# Altium footprint library PCBLIB.PcbLib: 775 footprints (part 39 of 49)
Each footprint in its own frame and in the unit in brackets; x right, y up, seen from the top. Pads: shape width x height; smd on the part's side, far side on the other; paste and mask are expansions set on the pad; w line width, h text height; cw(c..) or ccw(c..) is an arc to the next point about the centre after c.
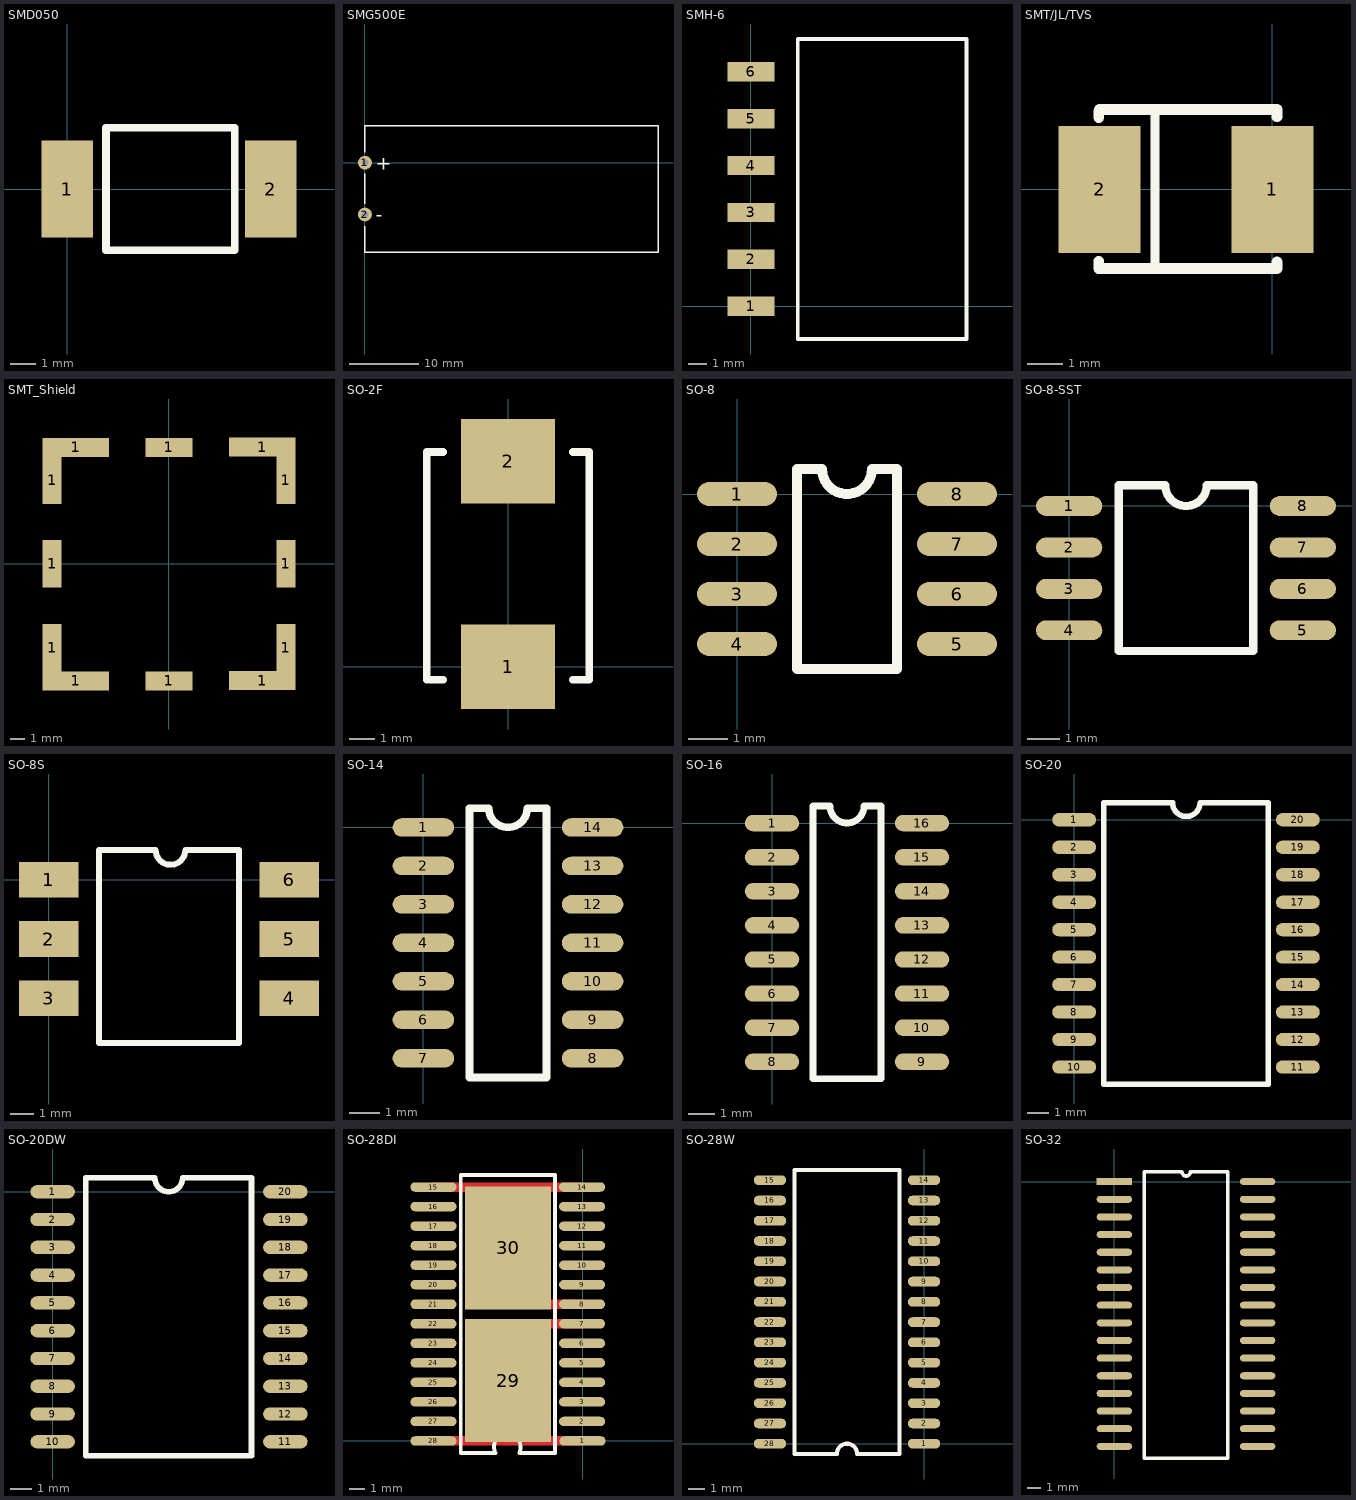
[diagram p38: the footprints below, top view; thin cyan lines are the x and y axes]

## SMD050 [mil]
pads (2):
  rect 80x150 smd: 1(0,0) 2(316,0)
TopOverlay:
  lines w12: 60,-95 60,95 260,95 260,-95 60,-95

## SMG500E [mm]
height 35.5
pads (2):
  round 2 hole 1: 1(0,0) 2(0,-7.5)
TopOverlay:
  lines w0.203: 0.009,-9.181 0.009,-12.947 42.427,-12.947 42.427,5.341 0.009,5.341 0.009,1.533 ; 0.009,-5.954 0.009,-1.605
  text "+" at 1.559,-1.031 h2.03
  text "-" at 1.594,-8.491 h2.03

## SMH-6 [mil]
pads (6):
  rect 100x41 smd: 1(0,0) 2(0,100) 3(0,200) 4(0,300) 5(0,400) 6(0,500)
TopOverlay:
  lines w8: 100,-70 100,570 460,570 460,-70 100,-70

## SMT/JL/TVS [mil]
pads (2):
  rect 90x140 smd: 1(0,0) 2(-190,0)
TopOverlay:
  lines w10: -129,-87 -129,88
  lines w12: -191,-87 -191,-79 ; -191,79 -191,86 ; -190,-87 5,-87 5,-80 ; -190,88 5,88 ; 5,80 5,87
Mechanical4:
  text ".105" at -189.77,0 h1
  text ".065" at -190,0 h1

## SMT_Shield [mm]
pads (12):
  rect 1.3x3.25 smd: 1(-8.002,0) 1(-8.002,5.716) 1(-8,-5.73) 1(8.001,-5.726) 1(8.003,0) 1(8.003,5.721)
  rect 4.55x1.3 smd: 1(-6.377,7.99) 1(-6.376,-8.005) 1(6.376,-8.001) 1(6.378,7.996)
  rect 3.25x1.3 smd: 1(0,-8.005) 1(0,7.989)

## SO-2F [mil]
pads (2):
  rect 145x130 smd: 1(0,0) 2(0,316)
TopOverlay:
  lines w12: -125,-20 -125,330 -100,330 ; -120,-20 -100,-20 ; 100,-20 125,-20 125,330 100,330
Mechanical4:
  text ".065" at 0,0 h1

## SO-8 [mil]
height 60
pads (8):
  oval 80x24 smd: 1(0,0) 2(0,-50) 3(0,-100) 4(0,-150) 5(220,-150) 6(220,-100) 7(220,-50) 8(220,0)
TopOverlay:
  lines w10: 60,-175 60,25 85,25 ccw(c110,25) 135,25 160,25 160,-175 60,-175
Mechanical4:
  text ".062" at 0,0 h1
  text ".065" at -0.44,0.48 h1

## SO-8-SST [mil]
pads (8):
  oval 80x24 smd: 1(0,0) 2(0,-50) 3(0,-100) 4(0,-150) 5(282,-150) 6(282,-100) 7(282,-50) 8(282,0)
TopOverlay:
  lines w10: 91,-175 191,-175 ; 137.71,-175 60,-175 60,25 91,25 116,25 ccw(c141,25) 166,25 191,25 222,25 222,-175 170.96,-175
Mechanical4:
  text ".062" at 31,0 h1

## SO-8S [mil]
pads (6):
  rect 100x60 smd: 1(0,0) 2(0,-100) 3(0,-200) 4(405,-200) 5(405,-100) 6(405,0)
TopOverlay:
  lines w10: 85,-275 320,-275 320,50 230,50 cw(c205,50) 180,50 85,50 85,-275

## SO-14 [mil]
height 65
pads (14):
  oval 80x24 smd: 1(0,0) 2(0,-50) 3(0,-100) 4(0,-150) 5(0,-200) 6(0,-250) 7(0,-300) 8(220,-300) 9(220,-250) 10(220,-200) 11(220,-150) 12(220,-100) 13(220,-50) 14(220,0)
TopOverlay:
  lines w10: 60,-325 160,-325 160,25 135,25 cw(c110,25) 85,25 60,25 60,-325
Mechanical4:
  text ".062" at 0,0 h1
  text ".065" at 0.19,0.86 h1

## SO-16 [mil]
pads (16):
  oval 80x24 smd: 1(0,0) 2(0,-50) 3(0,-100) 4(0,-150) 5(0,-200) 6(0,-250) 7(0,-300) 8(0,-350) 9(220,-350) 10(220,-300) 11(220,-250) 12(220,-200) 13(220,-150) 14(220,-100) 15(220,-50) 16(220,0)
TopOverlay:
  lines w10: 60,-375 160,-375 160,25 135,25 cw(c110,25) 85,25 60,25 60,-375
Mechanical4:
  text ".062" at 0,0 h1

## SO-20 [mil]
pads (20):
  oval 80x24 smd: 1(0,0) 2(0,-50) 3(0,-100) 4(0,-150) 5(0,-200) 6(0,-250) 7(0,-300) 8(0,-350) 9(0,-400) 10(0,-450) 11(407,-450) 12(407,-400) 13(407,-350) 14(407,-300) 15(407,-250) 16(407,-200) 17(407,-150) 18(407,-100) 19(407,-50) 20(407,0)
TopOverlay:
  lines w10: 54,-481 54,31 179,31 ccw(c204,31) 229,31 353,31 353,-481 54,-481
Mechanical4:
  text "0" at -1,-1 h1
  text ".062" at 0,0 h1

## SO-20DW [mil]
pads (20):
  oval 80x24 smd: 1(0,0) 2(0,-50) 3(0,-100) 4(0,-150) 5(0,-200) 6(0,-250) 7(0,-300) 8(0,-350) 9(0,-400) 10(0,-450) 11(419,-450) 12(419,-400) 13(419,-350) 14(419,-300) 15(419,-250) 16(419,-200) 17(419,-150) 18(419,-100) 19(419,-50) 20(419,0)
TopOverlay:
  lines w10: 60,-475 358,-475 358,25 234,25 cw(c209,25) 184,25 60,25 60,-475
Mechanical4:
  text ".105" at 0,0 h1
  text ".065" at 0,-0.48 h1

## SO-28DI [mm]
pads (30):
  oval 3x0.61 smd: 1(0,0) 2(-0.028,1.27) 3(-0.028,2.54) 4(-0.028,3.81) 5(-0.028,5.08) 6(-0.028,6.35) 7(-0.028,7.62) 8(-0.028,8.89) 9(-0.028,10.16) 10(-0.028,11.43) 11(-0.028,12.7) 12(-0.028,13.97) 13(-0.028,15.24) 14(-0.028,16.51) 15(-9.692,16.51) 16(-9.692,15.24) 17(-9.692,13.97) 18(-9.692,12.7) 19(-9.692,11.43) 20(-9.692,10.16) 21(-9.692,8.89) 22(-9.692,7.62) 23(-9.692,6.35) 24(-9.692,5.08) 25(-9.692,3.81) 26(-9.692,2.54) 27(-9.692,1.27) 28(-9.692,0)
  rect 5.6x8 smd: 29(-4.846,3.928) 30(-4.846,12.563)
TopLayer:
  lines w0.61: -9.692,0 0,0 ; -9.692,16.51 -0.028,16.51 ; -2.764,7.62 -0.028,7.62 ; -2.567,8.89 -0.028,8.89
TopOverlay:
  lines w0.254: -5.688,-0.744 cw(c-4.89,-0.4) -4.107,-0.777 ; -5.66,-0.795 -7.92,-0.795 -7.92,17.305 -1.8,17.305 -1.8,-0.795 -4.06,-0.795

## SO-28W [mil]
height 110
pads (28):
  oval 80x24 smd: 1(0,0) 2(0,50) 3(0,100) 4(0,150) 5(0,200) 6(0,250) 7(0,300) 8(0,350) 9(0,400) 10(0,450) 11(0,500) 12(0,550) 13(0,600) 14(0,650) 15(-380,650) 16(-380,600) 17(-380,550) 18(-380,500) 19(-380,450) 20(-380,400) 21(-380,350) 22(-380,300) 23(-380,250) 24(-380,200) 25(-380,150) 26(-380,100) 27(-380,50) 28(-380,0)
TopOverlay:
  lines w10: -320,-25 -320,675 -60,675 -60,-25 -165,-25 ccw(c-190,-25) -215,-25 -320,-25
Mechanical4:
  text "0.103" at 0,0 h1

## SO-32 [mil]
height 110
pads (32):
  rect 100x20 smd: 1(0,0)
  oval 100x20 smd: 2(0,-50) 3(0,-100) 4(0,-150) 5(0,-200) 6(0,-250) 7(0,-300) 8(0,-350) 9(0,-400) 10(0,-450) 11(0,-500) 12(0,-550) 13(0,-600) 14(0,-650) 15(0,-700) 16(0,-750) 17(406,-750) 18(406,-700) 19(406,-650) 20(406,-600) 21(406,-550) 22(406,-500) 23(406,-450) 24(406,-400) 25(406,-350) 26(406,-300) 27(406,-250) 28(406,-200) 29(406,-150) 30(406,-100) 31(406,-50) 32(406,0)
TopOverlay:
  lines w10: 85,25 85,-784 321,-784 321,25 ; 85,28 190.5,28 ; 191.48,28 ccw(c203.49,28) 215.5,28 321,28